# Altium footprint library pcblib_AGVcontrol.PcbLib: 34 footprints (part 2 of 3)
Each footprint in its own frame and in the unit in brackets; x right, y up, seen from the top. Pads: shape width x height; smd on the part's side, far side on the other; paste and mask are expansions set on the pad; w line width, h text height; cw(c..) or ccw(c..) is an arc to the next point about the centre after c.
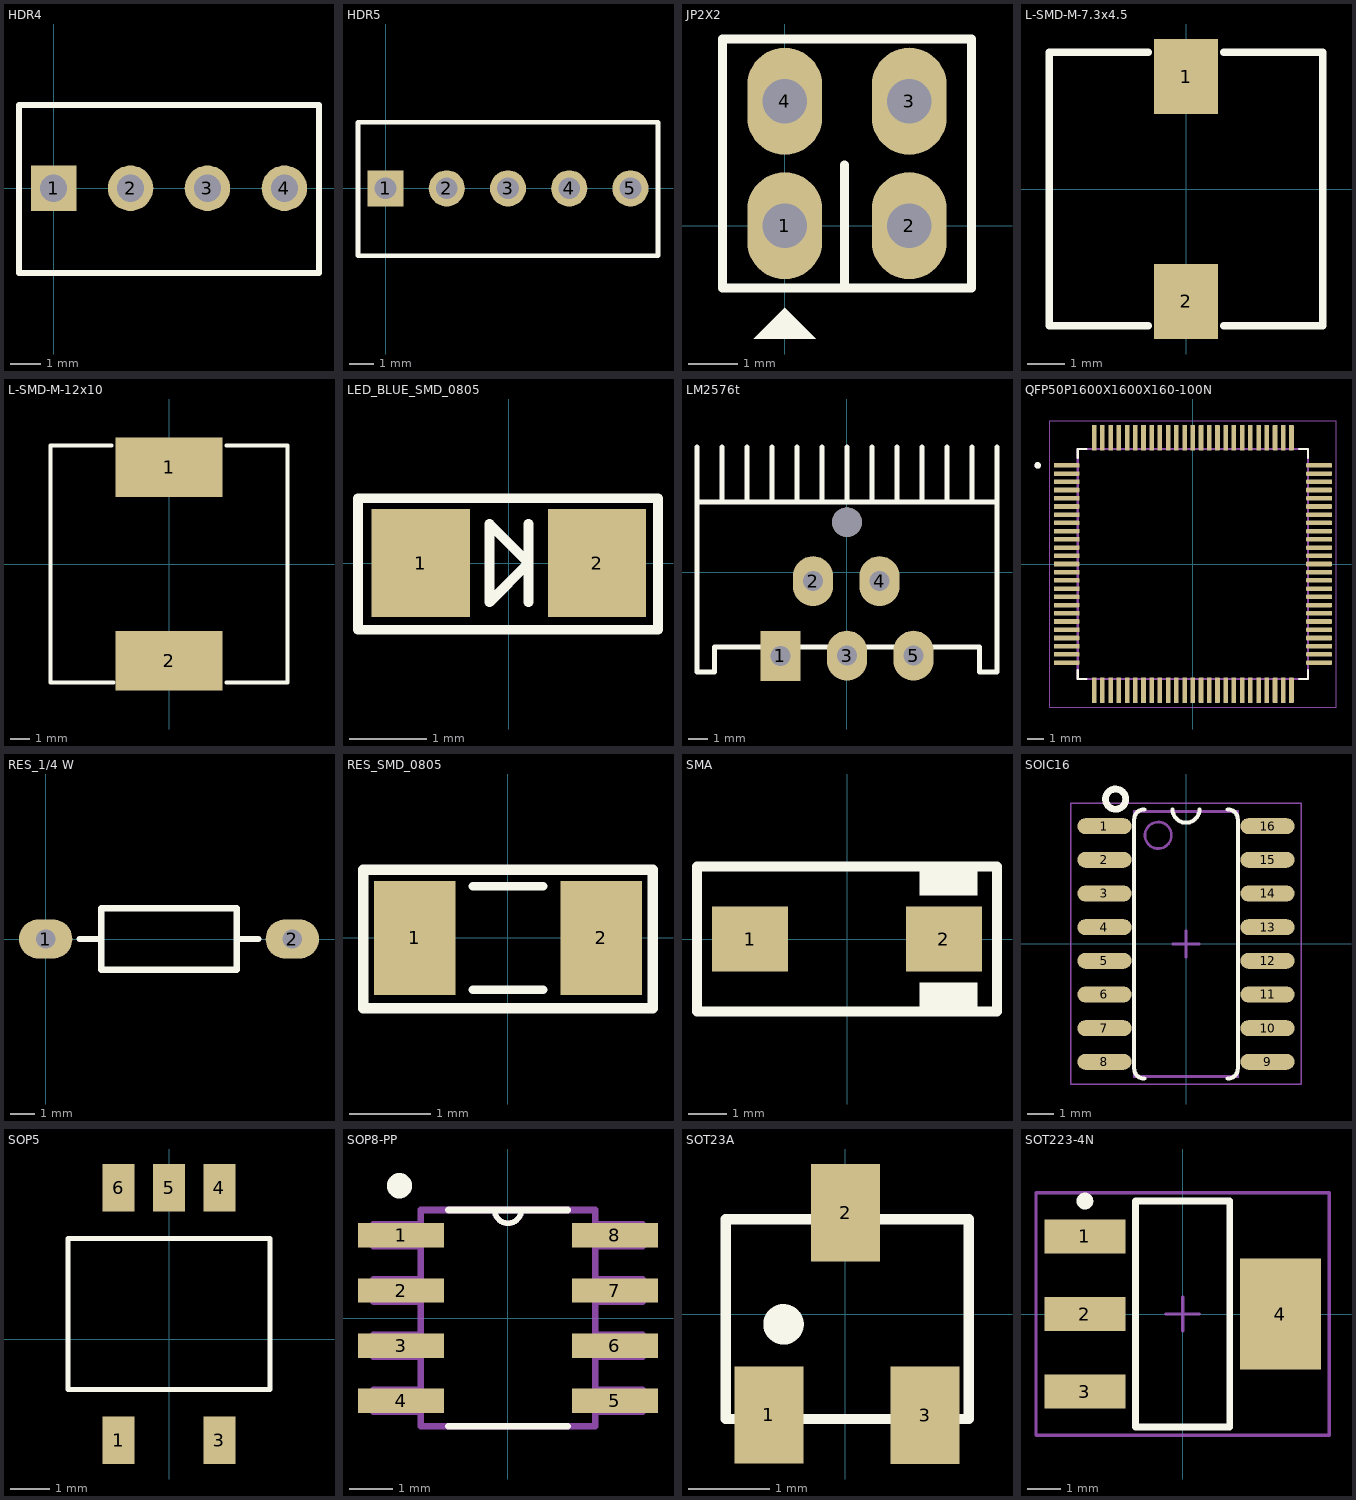
[diagram p1: the footprints below, top view; thin cyan lines are the x and y axes]

## HDR4 [mm] "Connector; Header; 4 Position"
pads (4):
  rect 1.5x1.5 hole 0.9: 1(0,0)
  round 1.5 hole 0.9: 2(2.54,0) 3(5.08,0) 4(7.62,0)
Top Overlay:
  lines w0.2: -1.143,-2.794 -1.143,2.743 8.763,2.743 8.763,-2.794 -1.143,-2.794
3D body "h4.stp": height 11.72, standoff -3.54, extent -1.27,-2.92 8.89,2.88

## HDR5 [mm] "Connector; Header; 5 Position"
pads (5):
  rect 1.5x1.5 hole 0.9: 1(0,0)
  round 1.5 hole 0.9: 2(2.54,0) 3(5.08,0) 4(7.62,0) 5(10.16,0)
Top Overlay:
  lines w0.2: -1.143,-2.794 11.303,-2.794 11.303,2.743 -1.143,2.743 -1.143,-2.794
3D body "h5.stp": height 11.72, standoff -3.54, extent -1.27,-2.92 11.43,2.88

## JP2X2 [mil]
pads (4):
  oval 60x86 hole 36: 1(0,0) 2(100,0) 3(100,100) 4(0,100)
Top Overlay:
  region: 0,-66 -25,-91 25,-91
  lines w7: 48,-50 48,49 ; -50,-50 -50,50 -50,150 150,150 150,-50 -50,-50
3D body "JP2X2.stp": height 335.25, standoff -117.51, extent -49.99,-49.99 150.01,150.01

## L-SMD-M-7.3x4.5 [mm] "68uH"
height 4
pads (2):
  rect 1.7x2 smd: 1(0,3) 2(0,-3)
Top Overlay:
  lines w0.2: -1,-3.65 -3.65,-3.65 -3.65,3.65 -1,3.65 ; 1,-3.65 3.65,-3.65 3.65,3.65 1,3.65
3D body "IndPDA_7345.stp": height 4.05, standoff 0.05, extent -3.65,-3.65 3.65,3.65

## L-SMD-M-12x10 [mm] "150uH"
height 10
pads (2):
  rect 5.4x3 smd: 1(0,4.9) 2(0,-4.9)
Top Overlay:
  lines w0.2: -2.9,6 -6,6 -6,-6 -2.8,-6 ; 2.9,-6 6,-6 6,6 2.9,6
3D body "IndPDA_1210.stp": height 9.7, standoff 0.04, extent -6,-6 6,6

## LED_BLUE_SMD_0805 [mil]
pads (2):
  rect 50x55 smd: 1(-45,0) 2(45,0)
Top Overlay:
  lines w5: 10,-20 10,20 ; -77,-34 -77,33 76,33 76,-34 -77,-34 ; -10,-20 10,0 -10,20 -10,-20
3D body: height 31.99, standoff 0.5, extent -41.34,-26.58 41.33,26.58

## LM2576t [mil]
pads (6):
  rect 80x100 hole 40: 1(-132,-167.09)
  oval 80x100 hole 40: 2(-67,-18) 3(1,-167) 4(66,-18) 5(134,-167)
  round 59.06 hole 59.06: ""(1,100)
Top Overlay:
  lines w10: -299,140 301,140 ; -299,250 -299,-200 -264,-200 -264,-150 266,-150 266,-200 301,-200 301,250 ; -249,140 -249,250 ; -199,140 -199,250 ; -149,140 -149,250 ; -99,140 -99,250 ; -49,140 -49,250 ; 1,140 1,250 ; 51,140 51,250 ; 101,140 101,250 ; 151,140 151,250 ; 201,140 201,250 ; 251,140 251,250
3D body "SW3dPS-TO220-5.STEP": height 859.05, standoff -85.43, extent -199,-174.91 201,149.5

## QFP50P1600X1600X160-100N [mm]
height 1.6
pads (100):
  rrect25% 1.56x0.28 smd: 1(-7.68,6) 2(-7.68,5.5) 3(-7.68,5) 4(-7.68,4.5) 5(-7.68,4) 6(-7.68,3.5) 7(-7.68,3) 8(-7.68,2.5) 9(-7.68,2) 10(-7.68,1.5) 11(-7.68,1) 12(-7.68,0.5) 13(-7.68,0) 14(-7.68,-0.5) 15(-7.68,-1) 16(-7.68,-1.5) 17(-7.68,-2) 18(-7.68,-2.5) 19(-7.68,-3) 20(-7.68,-3.5) 21(-7.68,-4) 22(-7.68,-4.5) 23(-7.68,-5) 24(-7.68,-5.5) 25(-7.68,-6) 51(7.68,-6) 52(7.68,-5.5) 53(7.68,-5) 54(7.68,-4.5) 55(7.68,-4) 56(7.68,-3.5) 57(7.68,-3) 58(7.68,-2.5) 59(7.68,-2) 60(7.68,-1.5) 61(7.68,-1) 62(7.68,-0.5) 63(7.68,0) 64(7.68,0.5) 65(7.68,1) 66(7.68,1.5) 67(7.68,2) 68(7.68,2.5) 69(7.68,3) 70(7.68,3.5) 71(7.68,4) 72(7.68,4.5) 73(7.68,5) 74(7.68,5.5) 75(7.68,6)
  rrect25% 0.28x1.56 smd: 26(-6,-7.68) 27(-5.5,-7.68) 28(-5,-7.68) 29(-4.5,-7.68) 30(-4,-7.68) 31(-3.5,-7.68) 32(-3,-7.68) 33(-2.5,-7.68) 34(-2,-7.68) 35(-1.5,-7.68) 36(-1,-7.68) 37(-0.5,-7.68) 38(0,-7.68) 39(0.5,-7.68) 40(1,-7.68) 41(1.5,-7.68) 42(2,-7.68) 43(2.5,-7.68) 44(3,-7.68) 45(3.5,-7.68) 46(4,-7.68) 47(4.5,-7.68) 48(5,-7.68) 49(5.5,-7.68) 50(6,-7.68) 76(6,7.68) 77(5.5,7.68) 78(5,7.68) 79(4.5,7.68) 80(4,7.68) 81(3.5,7.68) 82(3,7.68) 83(2.5,7.68) 84(2,7.68) 85(1.5,7.68) 86(1,7.68) 87(0.5,7.68) 88(0,7.68) 89(-0.5,7.68) 90(-1,7.68) 91(-1.5,7.68) 92(-2,7.68) 93(-2.5,7.68) 94(-3,7.68) 95(-3.5,7.68) 96(-4,7.68) 97(-4.5,7.68) 98(-5,7.68) 99(-5.5,7.68) 100(-6,7.68)
Top Overlay:
  circle w0.2: c-9.44,6 r0.1
  lines w0.127: -7,-6.46 -7,-7 -6.46,-7 ; -7,6.46 -7,7 -6.46,7 ; 6.46,-7 7,-7 7,-6.46 ; 6.46,7 7,7 7,6.46
Mechanical 13:
  circle w0.2: c-9.44,6 r0.1
  lines w0.127: -7,-7 7,-7 7,7 -7,7 -7,-7
Mechanical 15:
  lines w0.05: -8.71,-8.71 8.71,-8.71 8.71,8.71 -8.71,8.71 -8.71,-8.71
3D body "step_temp.STEP": height 1.6, standoff 0, extent -8,-8 8,8

## RES_1/4 W [mm]
pads (2):
  oval 2.2x1.6 hole 0.787: 1(0,0) 2(10.16,0)
Top Overlay:
  lines w0.254: 1.397,0 2.286,0 ; 7.874,0 8.763,0 ; 2.286,-1.27 7.874,-1.27 7.874,1.27 2.286,1.27 2.286,-1.27
3D body "User Library-Res40-Axial 0_25W-1R.STEP": height 2.49, standoff -1.92, extent -0.3,-1.2 10.46,1.2

## RES_SMD_0805 [mil]
pads (2):
  rect 39.37x55 smd: 1(-45,0) 2(45,0)
Top Overlay:
  lines w4: -17,-25 17,-25 ; -17,25 17,25
  lines w5: -70,-34 70,-34 70,33 -70,33 -70,-34
3D body "SW3dPS-0805 SMD Resistor.STEP": height 31.39, standoff 0.6, extent -39.36,-24.6 39.38,24.61

## SMA [mm]
pads (2):
  rect 2x1.7 smd: 1(-2.544,0) 2(2.544,0)
Top Overlay:
  region: 3.429,1.905 1.905,1.905 1.905,1.145 3.429,1.145
  rectangle: 1.905,-1.905 3.429,-1.145
  lines w0.254: -3.937,-1.903 -3.937,1.903 3.937,1.903 3.937,-1.903 -3.937,-1.903
3D body: height 2.29, standoff 0.2, extent -2.64,-1.395 2.642,1.395
3D body: height 0.2, standoff 0, extent -2.87,-0.864 -2.032,0.864
3D body: height 1.14, standoff 0, extent -2.87,-0.864 -2.718,0.864
3D body: height 1.14, standoff 0.94, extent -2.87,-0.864 -2.489,0.864
3D body: height 2.29, standoff 0.2, extent -2.642,-0.864 -2.032,0.864
3D body: height 2.29, standoff 0.2, extent 2.032,-0.864 2.642,0.864
3D body: height 1.14, standoff 0.94, extent 2.489,-0.864 2.87,0.864
3D body: height 1.14, standoff 0, extent 2.718,-0.864 2.87,0.864
3D body: height 0.2, standoff 0, extent 2.032,-0.864 2.87,0.864

## SOIC16 [mm] "ULN2003"
height 1.76
pads (16):
  oval 2.05x0.6 smd: 1(-3.075,4.445) 2(-3.075,3.175) 3(-3.075,1.905) 4(-3.075,0.635) 5(-3.075,-0.635) 6(-3.075,-1.905) 7(-3.075,-3.175) 8(-3.075,-4.445) 9(3.075,-4.445) 10(3.075,-3.175) 11(3.075,-1.905) 12(3.075,-0.635) 13(3.075,0.635) 14(3.075,1.905) 15(3.075,3.175) 16(3.075,4.445)
Top Overlay:
  circle w0.254: c-2.655,5.465 r0.381
  lines w0.152: -1.575,-5.08 cw(c-1.575,-4.699) -1.956,-4.699 -1.956,4.699 cw(c-1.575,4.699) -1.575,5.08 ; -0.508,5.08 ccw(c0,5.08) 0.508,5.08 ; 1.575,-5.08 ccw(c1.575,-4.699) 1.956,-4.699 1.956,4.699 ccw(c1.575,4.699) 1.575,5.08
Mechanical 13:
  circle w0.1: c-1.05,4.1 r0.5
  lines w0.1: -1.95,-5 -1.95,5 1.95,5 1.95,-5 -1.95,-5
Mechanical 15:
  lines w0.05: -4.35,-5.3 -4.35,5.3 4.35,5.3 4.35,-5.3 -4.35,-5.3
  lines w0.1: -0.5,0 0.5,0 ; 0,-0.5 0,0.5
3D body "SOIC16.step": height 1.75, standoff 0, extent -2.997,-5 2.997,5

## SOP5 [mm] "TLP115"
pads (5):
  rect 0.8x1.2 smd: 1(-1.27,-2.54) 3(1.27,-2.54) 4(1.27,3.81) 5(0,3.81) 6(-1.27,3.81)
Top Overlay:
  lines w0.127: -2.54,-1.27 2.54,-1.27 2.54,2.54 -2.54,2.54 -2.54,-1.27
3D body "TLP2361.step": height 2.2, standoff 0, extent -1.9,-2.879 1.9,4.149

## SOP8-PP [mil] "MAX485"
pads (8):
  rect 78x22 smd: 1(-96.99,75.01) 2(-96.99,25.01) 3(-96.99,-24.99) 4(-96.99,-74.99) 5(97.01,-74.99) 6(97.01,-24.99) 7(97.01,25.01) 8(97.01,75.01)
Top Overlay:
  circle w20: c-98.41,120 r1.41
  lines w5: -11.99,98.01 ccw(c0.01,98.01) 12.01,98.01
  lines w6: -53.99,-97.99 54.01,-97.99 ; -53.99,98.01 -11.99,98.01 12.01,98.01 54.01,98.01
Mechanical 13:
  lines w5: -11.99,98.01 ccw(c0.01,98.01) 12.01,98.01
  lines w6: -121.99,-84.99 -121.99,-64.99 -78.99,-64.99 -78.99,-84.99 -121.99,-84.99 ; -121.99,-34.99 -121.99,-14.99 -78.99,-14.99 -78.99,-34.99 -121.99,-34.99 ; -121.99,15.01 -121.99,35.01 -78.99,35.01 -78.99,15.01 -121.99,15.01 ; -121.99,65.01 -121.99,85.01 -78.99,85.01 -78.99,65.01 -121.99,65.01 ; -78.99,-97.99 79.01,-97.99 79.01,98.01 12.01,98.01 -11.99,98.01 -78.99,98.01 -78.99,-97.99 ; 79.01,-84.99 79.01,-64.99 122.01,-64.99 122.01,-84.99 79.01,-84.99 ; 79.01,-34.99 79.01,-14.99 122.01,-14.99 122.01,-34.99 79.01,-34.99 ; 79.01,15.01 79.01,35.01 122.01,35.01 122.01,15.01 79.01,15.01 ; 79.01,65.01 79.01,85.01 122.01,85.01 122.01,65.01 79.01,65.01
3D body "User Library-sop-8.STEP": height 62.99, standoff 0, extent -118.93,-98.82 118.94,98.82

## SOT23A [mm] "mosfet"
height 1.27
pads (3):
  rect 0.85x1.2 smd: 1(-0.94,-1.245) 2(0.005,1.25) 3(0.985,-1.25)
Top Overlay:
  circle w0.25: c-0.76,-0.127 r0.125
  lines w0.127: -1.473,-1.295 1.524,-1.295 1.524,1.168 -1.473,1.168 -1.473,-1.295
3D body "SW3DPS-SOT-23-DEFAULT.STEP": height 1.06, standoff -0.04, extent -1.5,-1.301 1.5,1.199

## SOT223-4N [mm] "LM1117"
height 1.8
pads (4):
  rect 2.4x1 smd: 1(-2.9,2.3) 2(-2.9,0) 3(-2.9,-2.3)
  rect 2.4x3.3 smd: 4(2.9,0)
Top Overlay:
  circle w0.25: c-2.9,3.35 r0.125
  lines w0.2: -1.4,-3.35 -1.4,3.35 1.4,3.35 1.4,-3.35 -1.4,-3.35
Mechanical 15:
  lines w0.1: -0.5,0 0.5,0 ; 0,-0.5 0,0.5 ; -4.35,-3.6 -4.35,3.6 4.35,3.6 4.35,-3.6 -4.35,-3.6
3D body "SW3dPS-Regulator.STEP": height 1.72, standoff 0.02, extent -3.395,-3.274 3.496,3.226